# Altium footprint library My Footprint 3D.PCBLIB: 447 footprints (part 14 of 29)
Each footprint in its own frame and in the unit in brackets; x right, y up, seen from the top. Pads: shape width x height; smd on the part's side, far side on the other; paste and mask are expansions set on the pad; w line width, h text height; cw(c..) or ccw(c..) is an arc to the next point about the centre after c.
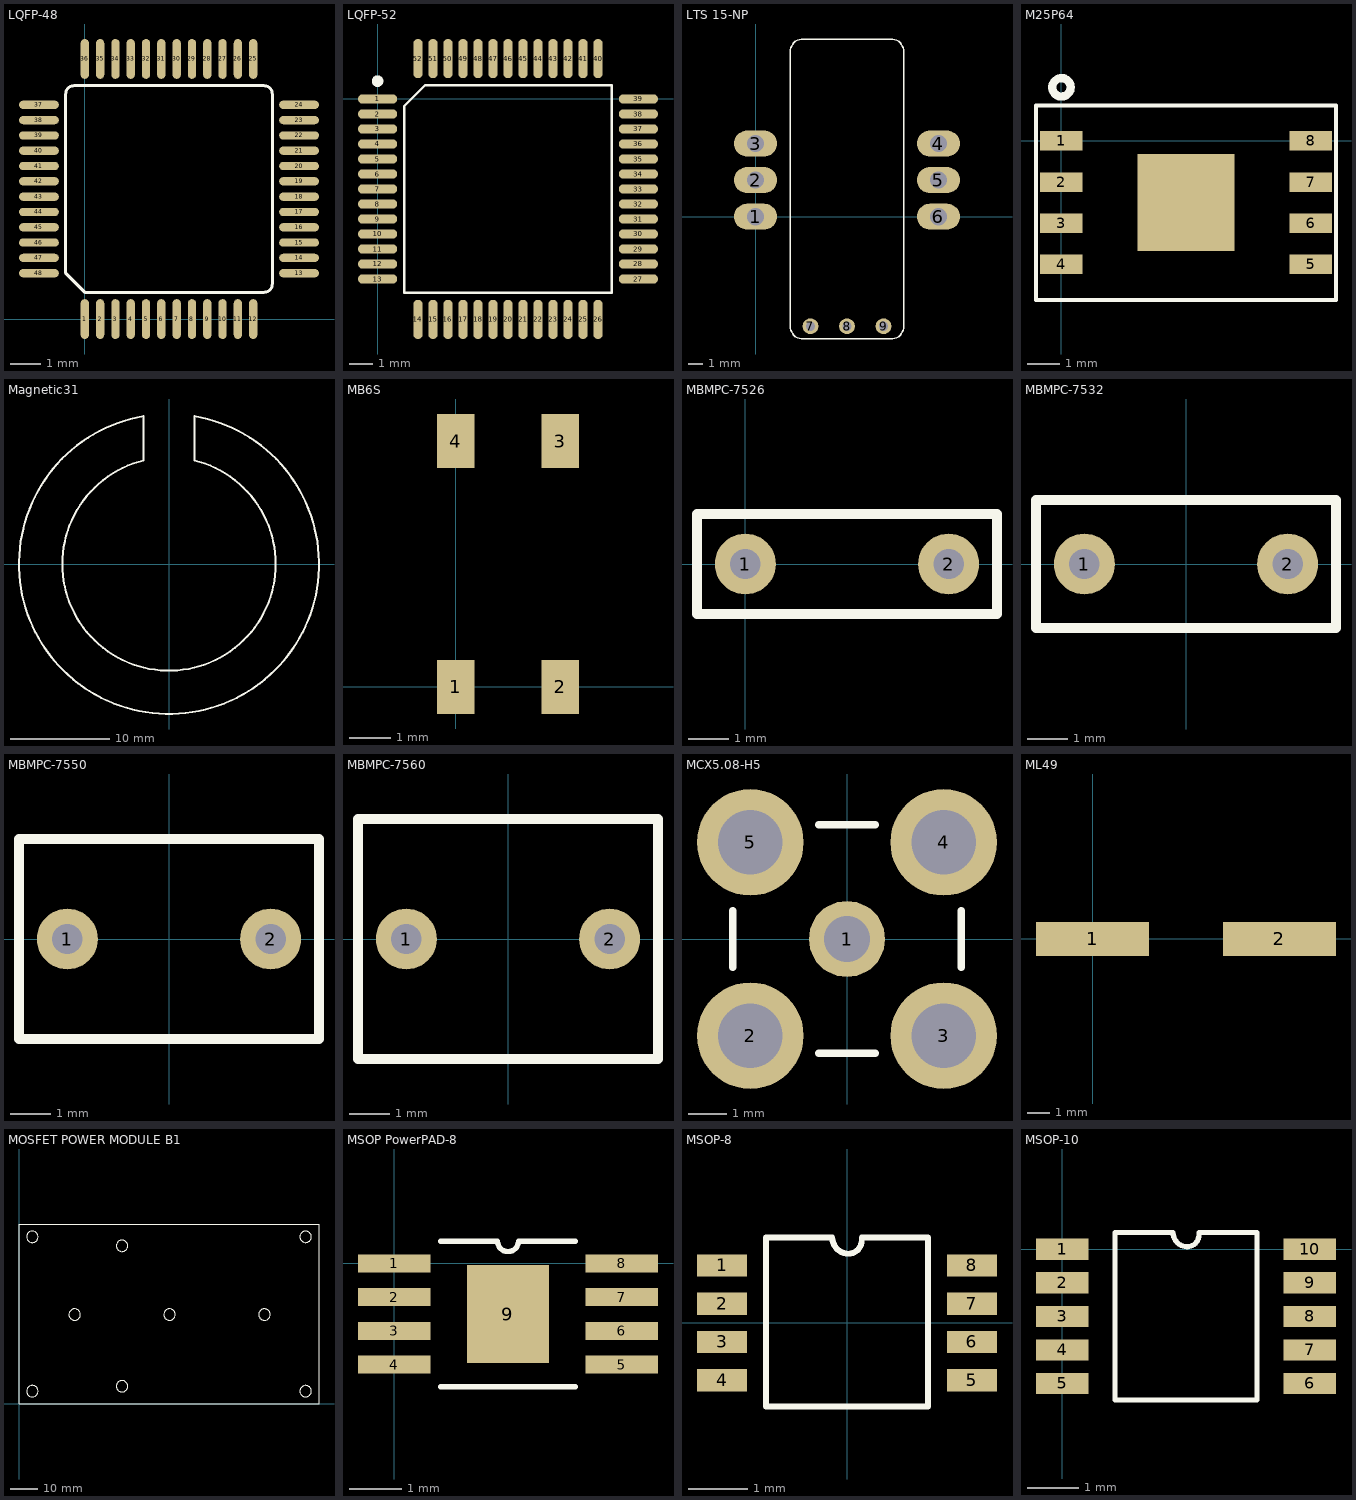
[diagram p13: the footprints below, top view; thin cyan lines are the x and y axes]

## LQFP-48 [mm] "distance 0.5mm"
pads (48):
  oval 0.27x1.3 smd: 1(0,0) 2(0.5,0) 3(1,0) 4(1.5,0) 5(2,0) 6(2.5,0) 7(3,0) 8(3.5,0) 9(4,0) 10(4.5,0) 11(5,0) 12(5.5,0) 25(5.5,8.5) 26(5,8.5) 27(4.5,8.5) 28(4,8.5) 29(3.5,8.5) 30(3,8.5) 31(2.5,8.5) 32(2,8.5) 33(1.5,8.5) 34(1,8.5) 35(0.5,8.5) 36(0,8.5)
  oval 1.3x0.27 smd: 13(7,1.5) 14(7,2) 15(7,2.5) 16(7,3) 17(7,3.5) 18(7,4) 19(7,4.5) 20(7,5) 21(7,5.5) 22(7,6) 23(7,6.5) 24(7,7) 37(-1.5,7) 38(-1.5,6.5) 39(-1.5,6) 40(-1.5,5.5) 41(-1.5,5) 42(-1.5,4.5) 43(-1.5,4) 44(-1.5,3.5) 45(-1.5,3) 46(-1.5,2.5) 47(-1.5,2) 48(-1.5,1.5)
Top Overlay:
  lines w0.1: -0.625,1.5 -0.625,7.35 cw(c-0.35,7.35) -0.35,7.625 5.85,7.625 cw(c5.85,7.35) 6.125,7.35 6.125,1.15 cw(c5.85,1.15) 5.85,0.875 0,0.875 -0.625,1.5
3D body: height 1, standoff 0.8, extent -0.127,0.406 0.127,0.66
3D body: height 1, standoff 0, extent -0.127,0.203 0.127,0.406
3D body: height 0.3, standoff 0, extent -0.127,-0.483 0.127,0.203
3D body: height 1.6, standoff 0.1, extent -0.857,0.643 6.382,7.857
3D body: height 1.61, standoff 1.6, extent -0.3,1.2 0.3,1.8
3D body: height 0.3, standoff 0, extent 0.373,-0.483 0.627,0.203
3D body: height 1, standoff 0, extent 0.373,0.203 0.627,0.406
3D body: height 1, standoff 0.8, extent 0.373,0.406 0.627,0.66
3D body: height 0.3, standoff 0, extent 0.873,-0.483 1.127,0.203
3D body: height 1, standoff 0, extent 0.873,0.203 1.127,0.406
3D body: height 1, standoff 0.8, extent 0.873,0.406 1.127,0.66
3D body: height 0.3, standoff 0, extent 1.373,-0.483 1.627,0.203
3D body: height 1, standoff 0, extent 1.373,0.203 1.627,0.406
3D body: height 1, standoff 0.8, extent 1.373,0.406 1.627,0.66
3D body: height 0.3, standoff 0, extent 1.873,-0.483 2.127,0.203
3D body: height 1, standoff 0, extent 1.873,0.203 2.127,0.406
3D body: height 1, standoff 0.8, extent 1.873,0.406 2.127,0.66
3D body: height 0.3, standoff 0, extent 2.373,-0.483 2.627,0.203
3D body: height 1, standoff 0, extent 2.373,0.203 2.627,0.406
3D body: height 1, standoff 0.8, extent 2.373,0.406 2.627,0.66
3D body: height 0.3, standoff 0, extent 2.873,-0.483 3.127,0.203
3D body: height 1, standoff 0, extent 2.873,0.203 3.127,0.406
3D body: height 1, standoff 0.8, extent 2.873,0.406 3.127,0.66
3D body: height 0.3, standoff 0, extent 3.373,-0.483 3.627,0.203
3D body: height 1, standoff 0, extent 3.373,0.203 3.627,0.406
3D body: height 1, standoff 0.8, extent 3.373,0.406 3.627,0.66
3D body: height 0.3, standoff 0, extent 3.873,-0.483 4.127,0.203
3D body: height 1, standoff 0, extent 3.873,0.203 4.127,0.406
3D body: height 1, standoff 0.8, extent 3.873,0.406 4.127,0.66
3D body: height 0.3, standoff 0, extent 4.373,-0.483 4.627,0.203
3D body: height 1, standoff 0, extent 4.373,0.203 4.627,0.406
3D body: height 1, standoff 0.8, extent 4.373,0.406 4.627,0.66
3D body: height 0.3, standoff 0, extent 4.873,-0.483 5.127,0.203
3D body: height 1, standoff 0, extent 4.873,0.203 5.127,0.406
3D body: height 1, standoff 0.8, extent 4.873,0.406 5.127,0.66
3D body: height 0.3, standoff 0, extent 5.373,-0.483 5.627,0.203
3D body: height 1, standoff 0, extent 5.373,0.203 5.627,0.406
3D body: height 1, standoff 0.8, extent 5.373,0.406 5.627,0.66
3D body: height 1, standoff 0.8, extent 6.34,6.873 6.594,7.127
3D body: height 1, standoff 0, extent 6.594,6.873 6.797,7.127
3D body: height 0.3, standoff 0, extent 6.797,6.873 7.483,7.127
3D body: height 1, standoff 0.8, extent 6.34,6.373 6.594,6.627
3D body: height 1, standoff 0, extent 6.594,6.373 6.797,6.627
3D body: height 0.3, standoff 0, extent 6.797,6.373 7.483,6.627
3D body: height 1, standoff 0.8, extent 6.34,5.873 6.594,6.127
3D body: height 1, standoff 0, extent 6.594,5.873 6.797,6.127
3D body: height 0.3, standoff 0, extent 6.797,5.873 7.483,6.127
3D body: height 1, standoff 0.8, extent 6.34,5.373 6.594,5.627
3D body: height 1, standoff 0, extent 6.594,5.373 6.797,5.627
3D body: height 0.3, standoff 0, extent 6.797,5.373 7.483,5.627
3D body: height 1, standoff 0.8, extent 6.34,4.873 6.594,5.127
3D body: height 1, standoff 0, extent 6.594,4.873 6.797,5.127
3D body: height 0.3, standoff 0, extent 6.797,4.873 7.483,5.127
3D body: height 1, standoff 0.8, extent 6.34,4.373 6.594,4.627
3D body: height 1, standoff 0, extent 6.594,4.373 6.797,4.627
3D body: height 0.3, standoff 0, extent 6.797,4.373 7.483,4.627
3D body: height 1, standoff 0.8, extent 6.34,3.873 6.594,4.127
3D body: height 1, standoff 0, extent 6.594,3.873 6.797,4.127
3D body: height 0.3, standoff 0, extent 6.797,3.873 7.483,4.127
3D body: height 1, standoff 0.8, extent 6.34,3.373 6.594,3.627
3D body: height 1, standoff 0, extent 6.594,3.373 6.797,3.627
3D body: height 0.3, standoff 0, extent 6.797,3.373 7.483,3.627
3D body: height 1, standoff 0.8, extent 6.34,2.873 6.594,3.127
3D body: height 1, standoff 0, extent 6.594,2.873 6.797,3.127
3D body: height 0.3, standoff 0, extent 6.797,2.873 7.483,3.127
3D body: height 1, standoff 0.8, extent 6.34,2.373 6.594,2.627
3D body: height 1, standoff 0, extent 6.594,2.373 6.797,2.627
3D body: height 0.3, standoff 0, extent 6.797,2.373 7.483,2.627
3D body: height 1, standoff 0.8, extent 6.34,1.873 6.594,2.127
3D body: height 1, standoff 0, extent 6.594,1.873 6.797,2.127
3D body: height 0.3, standoff 0, extent 6.797,1.873 7.483,2.127
3D body: height 0.3, standoff 0, extent 6.797,1.373 7.483,1.627
3D body: height 1, standoff 0, extent 6.594,1.373 6.797,1.627
3D body: height 1, standoff 0.8, extent 6.34,1.373 6.594,1.627
3D body: height 1, standoff 0.8, extent -0.127,7.84 0.127,8.094
3D body: height 1, standoff 0, extent -0.127,8.094 0.127,8.297
3D body: height 0.3, standoff 0, extent -0.127,8.297 0.127,8.983
3D body: height 1, standoff 0.8, extent 0.373,7.84 0.627,8.094
3D body: height 1, standoff 0, extent 0.373,8.094 0.627,8.297
3D body: height 0.3, standoff 0, extent 0.373,8.297 0.627,8.983
3D body: height 1, standoff 0.8, extent 0.873,7.84 1.127,8.094
3D body: height 1, standoff 0, extent 0.873,8.094 1.127,8.297
3D body: height 0.3, standoff 0, extent 0.873,8.297 1.127,8.983
3D body: height 1, standoff 0.8, extent 1.373,7.84 1.627,8.094
3D body: height 1, standoff 0, extent 1.373,8.094 1.627,8.297
3D body: height 0.3, standoff 0, extent 1.373,8.297 1.627,8.983
3D body: height 1, standoff 0.8, extent 1.873,7.84 2.127,8.094
3D body: height 1, standoff 0, extent 1.873,8.094 2.127,8.297
3D body: height 0.3, standoff 0, extent 1.873,8.297 2.127,8.983
3D body: height 1, standoff 0.8, extent 2.373,7.84 2.627,8.094
3D body: height 1, standoff 0, extent 2.373,8.094 2.627,8.297
3D body: height 0.3, standoff 0, extent 2.373,8.297 2.627,8.983
3D body: height 1, standoff 0.8, extent 2.873,7.84 3.127,8.094
3D body: height 1, standoff 0, extent 2.873,8.094 3.127,8.297
3D body: height 0.3, standoff 0, extent 2.873,8.297 3.127,8.983
3D body: height 1, standoff 0.8, extent 3.373,7.84 3.627,8.094
3D body: height 1, standoff 0, extent 3.373,8.094 3.627,8.297
3D body: height 0.3, standoff 0, extent 3.373,8.297 3.627,8.983
3D body: height 1, standoff 0.8, extent 3.873,7.84 4.127,8.094
3D body: height 1, standoff 0, extent 3.873,8.094 4.127,8.297
3D body: height 0.3, standoff 0, extent 3.873,8.297 4.127,8.983
3D body: height 1, standoff 0.8, extent 4.373,7.84 4.627,8.094
3D body: height 1, standoff 0, extent 4.373,8.094 4.627,8.297
3D body: height 0.3, standoff 0, extent 4.373,8.297 4.627,8.983
3D body: height 1, standoff 0.8, extent 4.873,7.84 5.127,8.094
3D body: height 1, standoff 0, extent 4.873,8.094 5.127,8.297
3D body: height 0.3, standoff 0, extent 4.873,8.297 5.127,8.983
3D body: height 0.3, standoff 0, extent 5.373,8.297 5.627,8.983
3D body: height 1, standoff 0, extent 5.373,8.094 5.627,8.297
3D body: height 1, standoff 0.8, extent 5.373,7.84 5.627,8.094
3D body: height 1, standoff 0.8, extent -1.094,1.373 -0.84,1.627
3D body: height 1, standoff 0, extent -1.297,1.373 -1.094,1.627
3D body: height 0.3, standoff 0, extent -1.983,1.373 -1.297,1.627
3D body: height 1, standoff 0.8, extent -1.094,1.873 -0.84,2.127
3D body: height 1, standoff 0, extent -1.297,1.873 -1.094,2.127
3D body: height 0.3, standoff 0, extent -1.983,1.873 -1.297,2.127
3D body: height 1, standoff 0.8, extent -1.094,2.373 -0.84,2.627
3D body: height 1, standoff 0, extent -1.297,2.373 -1.094,2.627
3D body: height 0.3, standoff 0, extent -1.983,2.373 -1.297,2.627
3D body: height 1, standoff 0.8, extent -1.094,2.873 -0.84,3.127
3D body: height 1, standoff 0, extent -1.297,2.873 -1.094,3.127
3D body: height 0.3, standoff 0, extent -1.983,2.873 -1.297,3.127
3D body: height 1, standoff 0.8, extent -1.094,3.373 -0.84,3.627
3D body: height 1, standoff 0, extent -1.297,3.373 -1.094,3.627
3D body: height 0.3, standoff 0, extent -1.983,3.373 -1.297,3.627
3D body: height 1, standoff 0.8, extent -1.094,3.873 -0.84,4.127
3D body: height 1, standoff 0, extent -1.297,3.873 -1.094,4.127
3D body: height 0.3, standoff 0, extent -1.983,3.873 -1.297,4.127
3D body: height 1, standoff 0.8, extent -1.094,4.373 -0.84,4.627
3D body: height 1, standoff 0, extent -1.297,4.373 -1.094,4.627
3D body: height 0.3, standoff 0, extent -1.983,4.373 -1.297,4.627
3D body: height 1, standoff 0.8, extent -1.094,4.873 -0.84,5.127
3D body: height 1, standoff 0, extent -1.297,4.873 -1.094,5.127
3D body: height 0.3, standoff 0, extent -1.983,4.873 -1.297,5.127
3D body: height 1, standoff 0.8, extent -1.094,5.373 -0.84,5.627
3D body: height 1, standoff 0, extent -1.297,5.373 -1.094,5.627
3D body: height 0.3, standoff 0, extent -1.983,5.373 -1.297,5.627
3D body: height 1, standoff 0.8, extent -1.094,5.873 -0.84,6.127
3D body: height 1, standoff 0, extent -1.297,5.873 -1.094,6.127
3D body: height 0.3, standoff 0, extent -1.983,5.873 -1.297,6.127
3D body: height 1, standoff 0.8, extent -1.094,6.373 -0.84,6.627
3D body: height 1, standoff 0, extent -1.297,6.373 -1.094,6.627
3D body: height 0.3, standoff 0, extent -1.983,6.373 -1.297,6.627
3D body: height 0.3, standoff 0, extent -1.983,6.873 -1.297,7.127
3D body: height 1, standoff 0, extent -1.297,6.873 -1.094,7.127
3D body: height 1, standoff 0.8, extent -1.094,6.873 -0.84,7.127

## LQFP-52 [mm]
pads (52):
  oval 1.7x0.4 smd: 1(0,0) 2(0,-0.65) 3(0,-1.3) 4(0,-1.95) 5(0,-2.6) 6(0,-3.25) 7(0,-3.9) 8(0,-4.55) 9(0,-5.2) 10(0,-5.85) 11(0,-6.5) 12(0,-7.15) 13(0,-7.8) 27(11.3,-7.8) 28(11.3,-7.15) 29(11.3,-6.5) 30(11.3,-5.85) 31(11.3,-5.2) 32(11.3,-4.55) 33(11.3,-3.9) 34(11.3,-3.25) 35(11.3,-2.6) 36(11.3,-1.95) 37(11.3,-1.3) 38(11.3,-0.65) 39(11.3,0)
  oval 0.4x1.7 smd: 14(1.75,-9.55) 15(2.4,-9.55) 16(3.05,-9.55) 17(3.7,-9.55) 18(4.35,-9.55) 19(5,-9.55) 20(5.65,-9.55) 21(6.3,-9.55) 22(6.95,-9.55) 23(7.6,-9.55) 24(8.25,-9.55) 25(8.9,-9.55) 26(9.55,-9.55) 40(9.55,1.75) 41(8.9,1.75) 42(8.25,1.75) 43(7.6,1.75) 44(6.95,1.75) 45(6.3,1.75) 46(5.65,1.75) 47(5,1.75) 48(4.35,1.75) 49(3.7,1.75) 50(3.05,1.75) 51(2.4,1.75) 52(1.75,1.75)
Top Overlay:
  circle w0.25: c0,0.775 r0.125
  lines w0.1: 1.15,-8.4 1.15,-0.4 1.15,-0.3 2.05,0.6 10.15,0.6 10.15,-8.4 1.15,-8.4
3D body: height 0.2, standoff 0, extent -0.494,-1.488 0.192,-1.11
3D body: height 0.7, standoff 0, extent 0.192,-1.488 0.395,-1.11
3D body: height 0.7, standoff 0.5, extent 0.395,-1.488 0.649,-1.11
3D body: height 0.2, standoff 0, extent -0.494,-0.838 0.192,-0.46
3D body: height 0.7, standoff 0, extent 0.192,-0.838 0.395,-0.46
3D body: height 0.7, standoff 0.5, extent 0.395,-0.838 0.649,-0.46
3D body: height 1.31, standoff 0.1, extent 1.5,-0.9 2.695,0.298
3D body: height 0.7, standoff 0.5, extent 0.395,-0.188 0.649,0.19
3D body: height 0.7, standoff 0, extent 0.192,-0.188 0.395,0.19
3D body: height 0.2, standoff 0, extent -0.494,-0.188 0.192,0.19
3D body: height 0.7, standoff 0.5, extent 0.395,-2.138 0.649,-1.76
3D body: height 0.7, standoff 0, extent 0.192,-2.138 0.395,-1.76
3D body: height 0.2, standoff 0, extent -0.494,-2.138 0.192,-1.76
3D body: height 0.7, standoff 0.5, extent 0.395,-2.788 0.649,-2.41
3D body: height 0.7, standoff 0, extent 0.192,-2.788 0.395,-2.41
3D body: height 0.2, standoff 0, extent -0.494,-2.788 0.192,-2.41
3D body: height 0.7, standoff 0.5, extent 0.395,-3.438 0.649,-3.06
3D body: height 0.7, standoff 0, extent 0.192,-3.438 0.395,-3.06
3D body: height 0.2, standoff 0, extent -0.494,-3.438 0.192,-3.06
3D body: height 0.7, standoff 0.5, extent 0.395,-4.088 0.649,-3.71
3D body: height 0.7, standoff 0, extent 0.192,-4.088 0.395,-3.71
3D body: height 0.2, standoff 0, extent -0.494,-4.088 0.192,-3.71
3D body: height 0.7, standoff 0.5, extent 0.395,-4.738 0.649,-4.36
3D body: height 0.7, standoff 0, extent 0.192,-4.738 0.395,-4.36
3D body: height 0.2, standoff 0, extent -0.494,-4.738 0.192,-4.36
3D body: height 0.7, standoff 0.5, extent 0.395,-5.388 0.649,-5.01
3D body: height 0.7, standoff 0, extent 0.192,-5.388 0.395,-5.01
3D body: height 0.2, standoff 0, extent -0.494,-5.388 0.192,-5.01
3D body: height 0.7, standoff 0.5, extent 0.395,-6.038 0.649,-5.66
3D body: height 0.7, standoff 0, extent 0.192,-6.038 0.395,-5.66
3D body: height 0.2, standoff 0, extent -0.494,-6.038 0.192,-5.66
3D body: height 0.7, standoff 0.5, extent 0.395,-6.688 0.649,-6.31
3D body: height 0.7, standoff 0, extent 0.192,-6.688 0.395,-6.31
3D body: height 0.2, standoff 0, extent -0.494,-6.688 0.192,-6.31
3D body: height 0.7, standoff 0.5, extent 0.395,-7.338 0.649,-6.96
3D body: height 0.7, standoff 0, extent 0.192,-7.338 0.395,-6.96
3D body: height 0.2, standoff 0, extent -0.494,-7.338 0.192,-6.96
3D body: height 0.7, standoff 0.5, extent 0.395,-7.988 0.649,-7.61
3D body: height 0.7, standoff 0, extent 0.192,-7.988 0.395,-7.61
3D body: height 0.2, standoff 0, extent -0.494,-7.988 0.192,-7.61
3D body: height 0.7, standoff 0.5, extent 1.56,-9.155 1.938,-8.901
3D body: height 0.7, standoff 0, extent 1.56,-9.358 1.938,-9.155
3D body: height 0.2, standoff 0, extent 1.56,-10.044 1.938,-9.358
3D body: height 0.7, standoff 0.5, extent 2.21,-9.155 2.588,-8.901
3D body: height 0.7, standoff 0, extent 2.21,-9.358 2.588,-9.155
3D body: height 0.2, standoff 0, extent 2.21,-10.044 2.588,-9.358
3D body: height 0.7, standoff 0.5, extent 2.86,-9.155 3.238,-8.901
3D body: height 0.7, standoff 0, extent 2.86,-9.358 3.238,-9.155
3D body: height 0.2, standoff 0, extent 2.86,-10.044 3.238,-9.358
3D body: height 0.7, standoff 0.5, extent 3.51,-9.155 3.888,-8.901
3D body: height 0.7, standoff 0, extent 3.51,-9.358 3.888,-9.155
3D body: height 0.2, standoff 0, extent 3.51,-10.044 3.888,-9.358
3D body: height 0.7, standoff 0.5, extent 4.16,-9.155 4.538,-8.901
3D body: height 0.7, standoff 0, extent 4.16,-9.358 4.538,-9.155
3D body: height 0.2, standoff 0, extent 4.16,-10.044 4.538,-9.358
3D body: height 0.7, standoff 0.5, extent 4.81,-9.155 5.188,-8.901
3D body: height 0.7, standoff 0, extent 4.81,-9.358 5.188,-9.155
3D body: height 0.2, standoff 0, extent 4.81,-10.044 5.188,-9.358
3D body: height 0.7, standoff 0.5, extent 5.46,-9.155 5.838,-8.901
3D body: height 0.7, standoff 0, extent 5.46,-9.358 5.838,-9.155
3D body: height 0.2, standoff 0, extent 5.46,-10.044 5.838,-9.358
3D body: height 0.7, standoff 0.5, extent 6.11,-9.155 6.488,-8.901
3D body: height 0.7, standoff 0, extent 6.11,-9.358 6.488,-9.155
3D body: height 0.2, standoff 0, extent 6.11,-10.044 6.488,-9.358
3D body: height 0.7, standoff 0.5, extent 6.76,-9.155 7.138,-8.901
3D body: height 0.7, standoff 0, extent 6.76,-9.358 7.138,-9.155
3D body: height 0.2, standoff 0, extent 6.76,-10.044 7.138,-9.358
3D body: height 0.7, standoff 0.5, extent 7.41,-9.155 7.788,-8.901
3D body: height 0.7, standoff 0, extent 7.41,-9.358 7.788,-9.155
3D body: height 0.2, standoff 0, extent 7.41,-10.044 7.788,-9.358
3D body: height 0.7, standoff 0.5, extent 8.06,-9.155 8.438,-8.901
3D body: height 0.7, standoff 0, extent 8.06,-9.358 8.438,-9.155
3D body: height 0.2, standoff 0, extent 8.06,-10.044 8.438,-9.358
3D body: height 0.7, standoff 0.5, extent 8.71,-9.155 9.088,-8.901
3D body: height 0.7, standoff 0, extent 8.71,-9.358 9.088,-9.155
3D body: height 0.2, standoff 0, extent 8.71,-10.044 9.088,-9.358
3D body: height 0.7, standoff 0.5, extent 9.36,-9.155 9.738,-8.901
3D body: height 0.7, standoff 0, extent 9.36,-9.358 9.738,-9.155
3D body: height 0.2, standoff 0, extent 9.36,-10.044 9.738,-9.358
3D body: height 0.7, standoff 0.5, extent 10.651,-7.99 10.905,-7.612
3D body: height 0.7, standoff 0, extent 10.905,-7.99 11.108,-7.612
3D body: height 0.2, standoff 0, extent 11.108,-7.99 11.794,-7.612
3D body: height 0.7, standoff 0.5, extent 10.651,-7.34 10.905,-6.962
3D body: height 0.7, standoff 0, extent 10.905,-7.34 11.108,-6.962
3D body: height 0.2, standoff 0, extent 11.108,-7.34 11.794,-6.962
3D body: height 0.7, standoff 0.5, extent 10.651,-6.69 10.905,-6.312
3D body: height 0.7, standoff 0, extent 10.905,-6.69 11.108,-6.312
3D body: height 0.2, standoff 0, extent 11.108,-6.69 11.794,-6.312
3D body: height 0.7, standoff 0.5, extent 10.651,-6.04 10.905,-5.662
3D body: height 0.7, standoff 0, extent 10.905,-6.04 11.108,-5.662
3D body: height 0.2, standoff 0, extent 11.108,-6.04 11.794,-5.662
3D body: height 0.7, standoff 0.5, extent 10.651,-5.39 10.905,-5.012
3D body: height 0.7, standoff 0, extent 10.905,-5.39 11.108,-5.012
3D body: height 0.2, standoff 0, extent 11.108,-5.39 11.794,-5.012
3D body: height 0.7, standoff 0.5, extent 10.651,-4.74 10.905,-4.362
3D body: height 0.7, standoff 0, extent 10.905,-4.74 11.108,-4.362
3D body: height 0.2, standoff 0, extent 11.108,-4.74 11.794,-4.362
3D body: height 0.7, standoff 0.5, extent 10.651,-4.09 10.905,-3.712
3D body: height 0.7, standoff 0, extent 10.905,-4.09 11.108,-3.712
3D body: height 0.2, standoff 0, extent 11.108,-4.09 11.794,-3.712
3D body: height 0.7, standoff 0.5, extent 10.651,-3.44 10.905,-3.062
3D body: height 0.7, standoff 0, extent 10.905,-3.44 11.108,-3.062
3D body: height 0.2, standoff 0, extent 11.108,-3.44 11.794,-3.062
3D body: height 0.7, standoff 0.5, extent 10.651,-2.79 10.905,-2.412
3D body: height 0.7, standoff 0, extent 10.905,-2.79 11.108,-2.412
3D body: height 0.2, standoff 0, extent 11.108,-2.79 11.794,-2.412
3D body: height 0.7, standoff 0.5, extent 10.651,-2.14 10.905,-1.762
3D body: height 0.7, standoff 0, extent 10.905,-2.14 11.108,-1.762
3D body: height 0.2, standoff 0, extent 11.108,-2.14 11.794,-1.762
3D body: height 0.7, standoff 0.5, extent 10.651,-1.49 10.905,-1.112
3D body: height 0.7, standoff 0, extent 10.905,-1.49 11.108,-1.112
3D body: height 0.2, standoff 0, extent 11.108,-1.49 11.794,-1.112
3D body: height 0.7, standoff 0.5, extent 10.651,-0.84 10.905,-0.462
3D body: height 0.7, standoff 0, extent 10.905,-0.84 11.108,-0.462
3D body: height 0.2, standoff 0, extent 11.108,-0.84 11.794,-0.462
3D body: height 0.7, standoff 0.5, extent 10.651,-0.19 10.905,0.188
3D body: height 0.7, standoff 0, extent 10.905,-0.19 11.108,0.188
3D body: height 0.2, standoff 0, extent 11.108,-0.19 11.794,0.188
3D body: height 0.7, standoff 0.5, extent 9.362,1.101 9.74,1.355
3D body: height 0.7, standoff 0, extent 9.362,1.355 9.74,1.558
3D body: height 0.2, standoff 0, extent 9.362,1.558 9.74,2.244
3D body: height 0.7, standoff 0.5, extent 8.712,1.101 9.09,1.355
3D body: height 0.7, standoff 0, extent 8.712,1.355 9.09,1.558
3D body: height 0.2, standoff 0, extent 8.712,1.558 9.09,2.244
3D body: height 0.7, standoff 0.5, extent 8.062,1.101 8.44,1.355
3D body: height 0.7, standoff 0, extent 8.062,1.355 8.44,1.558
3D body: height 0.2, standoff 0, extent 8.062,1.558 8.44,2.244
3D body: height 0.7, standoff 0.5, extent 7.412,1.101 7.79,1.355
3D body: height 0.7, standoff 0, extent 7.412,1.355 7.79,1.558
3D body: height 0.2, standoff 0, extent 7.412,1.558 7.79,2.244
3D body: height 0.7, standoff 0.5, extent 6.762,1.101 7.14,1.355
3D body: height 0.7, standoff 0, extent 6.762,1.355 7.14,1.558
3D body: height 0.2, standoff 0, extent 6.762,1.558 7.14,2.244
3D body: height 0.7, standoff 0.5, extent 6.112,1.101 6.49,1.355
3D body: height 0.7, standoff 0, extent 6.112,1.355 6.49,1.558
3D body: height 0.2, standoff 0, extent 6.112,1.558 6.49,2.244
3D body: height 0.7, standoff 0.5, extent 5.462,1.101 5.84,1.355
3D body: height 0.7, standoff 0, extent 5.462,1.355 5.84,1.558
3D body: height 0.2, standoff 0, extent 5.462,1.558 5.84,2.244
3D body: height 0.7, standoff 0.5, extent 4.812,1.101 5.19,1.355
3D body: height 0.7, standoff 0, extent 4.812,1.355 5.19,1.558
3D body: height 0.2, standoff 0, extent 4.812,1.558 5.19,2.244
3D body: height 0.7, standoff 0.5, extent 4.162,1.101 4.54,1.355
3D body: height 0.7, standoff 0, extent 4.162,1.355 4.54,1.558
3D body: height 0.2, standoff 0, extent 4.162,1.558 4.54,2.244
3D body: height 0.7, standoff 0.5, extent 3.512,1.101 3.89,1.355
3D body: height 0.7, standoff 0, extent 3.512,1.355 3.89,1.558
3D body: height 0.2, standoff 0, extent 3.512,1.558 3.89,2.244
3D body: height 0.7, standoff 0.5, extent 2.862,1.101 3.24,1.355
3D body: height 0.7, standoff 0, extent 2.862,1.355 3.24,1.558
3D body: height 0.2, standoff 0, extent 2.862,1.558 3.24,2.244
3D body: height 0.7, standoff 0.5, extent 2.212,1.101 2.59,1.355
3D body: height 0.7, standoff 0, extent 2.212,1.355 2.59,1.558
3D body: height 0.2, standoff 0, extent 2.212,1.558 2.59,2.244
3D body: height 0.7, standoff 0.5, extent 1.562,1.101 1.94,1.355
3D body: height 0.7, standoff 0, extent 1.562,1.355 1.94,1.558
3D body: height 0.2, standoff 0, extent 1.562,1.558 1.94,2.244
3D body: height 1.2, standoff 0.1, extent 0.65,-8.9 10.65,1.1

## LTS 15-NP [mm]
pads (9):
  oval 3x1.8 hole 1.2: 1(0,0) 2(0,2.54) 3(0,5.08) 4(12.7,5.08) 5(12.7,2.54) 6(12.7,0)
  round 1.1 hole 0.65: 7(3.81,-7.62) 8(6.35,-7.62) 9(8.89,-7.62)
Top Overlay:
  lines w0.1: 2.4,-7.6 ccw(c3.3,-7.6) 3.3,-8.5 9.4,-8.5 ccw(c9.4,-7.6) 10.3,-7.6 10.3,11.44 ccw(c9.4,11.44) 9.4,12.34 3.3,12.34 ccw(c3.3,11.44) 2.4,11.44 2.4,-7.6
3D body: height 2, standoff -1.5, extent 12.3,4.58 13.1,5.58
3D body: height 9.3, standoff 8.5, extent 11.1,4.08 13.1,6.08
3D body: height 9.3, standoff 0.5, extent 12.3,4.08 13.1,6.08
3D body: height 2, standoff -1.5, extent 12.3,2.04 13.1,3.04
3D body: height 9.3, standoff 8.5, extent 11.1,1.54 13.1,3.54
3D body: height 9.3, standoff 0.5, extent 12.3,1.54 13.1,3.54
3D body: height 2, standoff -1.5, extent 12.3,-0.5 13.1,0.5
3D body: height 9.3, standoff 8.5, extent 11.1,-1 13.1,1
3D body: height 9.3, standoff 0.5, extent 12.3,-1 13.1,1
3D body: height 2, standoff -1.5, extent -0.4,4.58 0.4,5.58
3D body: height 9.3, standoff 8.5, extent -0.4,4.08 1.6,6.08
3D body: height 9.3, standoff 0.5, extent -0.4,4.08 0.4,6.08
3D body: height 2, standoff -1.5, extent -0.4,2.04 0.4,3.04
3D body: height 9.3, standoff 8.5, extent -0.4,1.54 1.6,3.54
3D body: height 9.3, standoff 0.5, extent -0.4,1.54 0.4,3.54
3D body: height 24, standoff 21, extent 1.6,-9.07 11.1,-6.082
3D body: height 12.5, standoff 0, extent 1.6,4.967 11.1,12.967
3D body: height 20.5, standoff 0, extent 1.6,-9.07 11.1,4.998
3D body: height 20.48, standoff 4.52, extent 1.6,-2.97 11.1,12.967
3D body: height 24, standoff 21, extent 1.6,-2.064 11.1,0.924
3D body: height 22.5, standoff 20.5, extent 1.6,-9.07 11.1,0.924
3D body: height 24, standoff 20.5, extent 1.6,-7.576 11.1,-0.57
3D body: height 14, standoff 11, extent 1.55,1.536 11.15,4.524
3D body: height 9.3, standoff 0.5, extent -0.4,-1 0.4,1
3D body: height 9.3, standoff 8.5, extent -0.4,-1 1.6,1
3D body: height 2, standoff -1.5, extent -0.4,-0.5 0.4,0.5

## M25P64 [mm] "Body 6mmX8mm"
height 1
pads (9):
  rect 1.3x0.6 smd: 1(0,0) 2(0,-1.27) 3(0,-2.54) 4(0,-3.81) 5(7.7,-3.81) 6(7.7,-2.54) 7(7.7,-1.27) 8(7.7,0)
  rect 3x3 smd: ""(3.85,-1.905)
Top Overlay:
  circle w0.254: c0.01,1.651 r0.284
  lines w0.127: -0.777,-4.905 8.477,-4.905 8.477,1.095 -0.777,1.095 -0.777,-4.905

## Magnetic31 [mm]
height 9
Top Overlay:
  lines w0.2: 2.535,10.395 cw(c0,0) -2.535,10.395 -2.536,14.835 ccw(c0,0) 2.536,14.835 2.54,10.414

## MB6S [mm]
pads (4):
  rect 0.9x1.3 smd: 1(0,0) 2(2.5,0) 3(2.5,5.9) 4(0,5.9)
3D body: height 3.01, standoff 3, extent -0.594,1.402 0.004,2.001
3D body: height 0.2, standoff 0, extent -0.3,5.75 0.3,6.25
3D body: height 1.6, standoff 0, extent -0.3,5.55 0.3,5.75
3D body: height 1.6, standoff 1.4, extent -0.3,4.95 0.3,5.55
3D body: height 0.2, standoff 0, extent 2.2,5.75 2.8,6.25
3D body: height 1.6, standoff 0, extent 2.2,5.55 2.8,5.75
3D body: height 1.6, standoff 1.4, extent 2.2,4.95 2.8,5.55
3D body: height 0.2, standoff 0, extent 2.2,-0.35 2.8,0.15
3D body: height 1.6, standoff 0, extent 2.2,0.15 2.8,0.35
3D body: height 1.6, standoff 1.4, extent 2.2,0.35 2.8,0.95
3D body: height 3, standoff 0, extent -1.1,0.95 3.6,4.95
3D body: height 1.6, standoff 1.4, extent -0.3,0.35 0.3,0.95
3D body: height 1.6, standoff 0, extent -0.3,0.15 0.3,0.35
3D body: height 0.2, standoff 0, extent -0.3,-0.35 0.3,0.15

## MBMPC-7526 [mil]
pads (2):
  round 60 hole 30: 1(0,0) 2(200,0)
Top Overlay:
  lines w10: -47.64,-49.21 247.64,-49.21 247.64,49.21 -47.64,49.21 -47.64,-49.21

## MBMPC-7532 [mil]
pads (2):
  round 60 hole 30: 1(-100,0) 2(100,0)
Top Overlay:
  lines w10: -147.64,-62.99 147.64,-62.99 147.64,62.99 -147.64,62.99 -147.64,-62.99

## MBMPC-7550 [mil]
pads (2):
  round 60 hole 30: 1(-100,0) 2(100,0)
Top Overlay:
  lines w10: -147.64,-98.43 147.64,-98.43 147.64,98.43 -147.64,98.43 -147.64,-98.43

## MBMPC-7560 [mil]
pads (2):
  round 60 hole 30: 1(-100,0) 2(100,0)
Top Overlay:
  lines w10: -147.64,-118.11 -147.64,118.11 147.64,118.11 147.64,-118.11 -147.64,-118.11

## MCX5.08-H5 [mm]
pads (5):
  round 2 hole 1.2: 1(0,0)
  round 2.8 hole 1.7: 2(-2.54,-2.54) 3(2.54,-2.54) 4(2.54,2.54) 5(-2.54,2.54)
Top Overlay:
  lines w0.2: -3,-0.74 -3,0.74 ; -0.74,-3 0.74,-3 ; -0.74,3 0.74,3 ; 3,-0.74 3,0.74

## ML49 [mm]
height 7
pads (2):
  rect 5x1.5 smd: 1(0,0) 2(8.255,0)
3D body: height 1, standoff 0.2, extent -1.623,1.1 -0.423,2.3
3D body: height 1, standoff 0.2, extent 8.677,1.1 9.877,2.3
3D body: height 1, standoff 0.2, extent 8.677,-2.3 9.877,-1.1
3D body: height 1, standoff 0.2, extent -1.623,-2.3 -0.423,-1.1
3D body: height 0.3, standoff 0, extent 5.9,-0.3 10.4,0.5
3D body: height 0.3, standoff 0, extent -2.073,-0.4 2.427,0.4
3D body: height 4, standoff 0.2, extent -1.272,-2.1 9.527,2.1
3D body: height 1.2, standoff 0.6, extent -1.623,-2.3 9.877,2.3
3D body: height 0.6, standoff 0, extent -1.623,-2.3 9.877,2.3

## MOSFET POWER MODULE B1 [mm]
Top Overlay:
  circle w0.254: c4.9,4.7 r2.1
  circle w0.254: c4.9,61.3 r2.1
  circle w0.254: c37.8,6.5 r2.1
  circle w0.254: c37.8,58 r2.1
  circle w0.254: c20.4,32.8 r2.1
  circle w0.254: c55.2,32.8 r2.1
  circle w0.254: c90,32.8 r2.1
  circle w0.254: c105.1,4.7 r2.1
  circle w0.254: c105.1,61.3 r2.1
  lines w0.2: 0,0 110,0 110,66 0,66 0,0

## MSOP PowerPAD-8 [mm]
pads (9):
  rect 1.4x0.35 smd: 1(0,0) 2(0,-0.65) 3(0,-1.3) 4(0,-1.95) 5(4.375,-1.95) 6(4.375,-1.3) 7(4.375,-0.65) 8(4.375,0)
  rect 1.57x1.89 smd: 9(2.187,-0.975)
Top Overlay:
  lines w0.1: 0.887,-2.375 3.487,-2.375 ; 0.887,0.425 1.987,0.425 ccw(c2.187,0.425) 2.387,0.425 3.487,0.425
3D body: height 1.01, standoff 0, extent 1.115,-0.199 1.713,0.399
3D body: height 0.2, standoff 0, extent -0.363,-0.2 0.237,0.2
3D body: height 0.6, standoff 0, extent 0.237,-0.2 0.437,0.2
3D body: height 0.6, standoff 0.4, extent 0.437,-0.2 0.687,0.2
3D body: height 1, standoff 0, extent 0.688,-2.575 3.688,0.625
3D body: height 0.6, standoff 0.4, extent 0.437,-0.85 0.687,-0.45
3D body: height 0.6, standoff 0, extent 0.237,-0.85 0.437,-0.45
3D body: height 0.2, standoff 0, extent -0.363,-0.85 0.237,-0.45
3D body: height 0.6, standoff 0.4, extent 0.437,-1.5 0.687,-1.1
3D body: height 0.6, standoff 0, extent 0.237,-1.5 0.437,-1.1
3D body: height 0.2, standoff 0, extent -0.363,-1.5 0.237,-1.1
3D body: height 0.6, standoff 0.4, extent 0.437,-2.15 0.687,-1.75
3D body: height 0.6, standoff 0, extent 0.237,-2.15 0.437,-1.75
3D body: height 0.2, standoff 0, extent -0.363,-2.15 0.237,-1.75
3D body: height 0.6, standoff 0.4, extent 3.688,-2.15 3.938,-1.75
3D body: height 0.6, standoff 0, extent 3.938,-2.15 4.138,-1.75
3D body: height 0.2, standoff 0, extent 4.138,-2.15 4.738,-1.75
3D body: height 0.6, standoff 0.4, extent 3.688,-1.5 3.938,-1.1
3D body: height 0.6, standoff 0, extent 3.938,-1.5 4.138,-1.1
3D body: height 0.2, standoff 0, extent 4.138,-1.5 4.738,-1.1
3D body: height 0.6, standoff 0.4, extent 3.688,-0.85 3.938,-0.45
3D body: height 0.6, standoff 0, extent 3.938,-0.85 4.138,-0.45
3D body: height 0.2, standoff 0, extent 4.138,-0.85 4.738,-0.45
3D body: height 0.6, standoff 0.4, extent 3.688,-0.2 3.938,0.2
3D body: height 0.6, standoff 0, extent 3.938,-0.2 4.138,0.2
3D body: height 0.2, standoff 0, extent 4.138,-0.2 4.738,0.2

## MSOP-8 [mm]
height 0.86
pads (8):
  rect 0.85x0.38 smd: 1(-2.125,0.975) 2(-2.125,0.325) 3(-2.125,-0.325) 4(-2.125,-0.975) 5(2.125,-0.975) 6(2.125,-0.325) 7(2.125,0.325) 8(2.125,0.975)
Top Overlay:
  lines w0.1: -1.375,-1.425 1.375,-1.425 1.375,1.45 0.25,1.45 0.25,1.4 cw(c0.025,1.4) 0.025,1.175 cw(c0.025,1.45) -0.25,1.45 -1.375,1.45 -1.375,-1.425
3D body: height 1, standoff 0, extent -1.5,-1.55 1.5,1.55
3D body: height 0.6, standoff 0.4, extent -1.75,0.775 -1.5,1.175
3D body: height 0.6, standoff 0, extent -1.95,0.775 -1.75,1.175
3D body: height 0.2, standoff 0, extent -2.5,0.775 -1.95,1.175
3D body: height 1.01, standoff 0, extent -1.173,0.701 -0.575,1.299
3D body: height 0.2, standoff 0, extent -2.5,0.125 -1.95,0.525
3D body: height 0.6, standoff 0, extent -1.95,0.125 -1.75,0.525
3D body: height 0.6, standoff 0.4, extent -1.75,0.125 -1.5,0.525
3D body: height 0.2, standoff 0, extent -2.5,-0.525 -1.95,-0.125
3D body: height 0.6, standoff 0, extent -1.95,-0.525 -1.75,-0.125
3D body: height 0.6, standoff 0.4, extent -1.75,-0.525 -1.5,-0.125
3D body: height 0.2, standoff 0, extent -2.5,-1.175 -1.95,-0.775
3D body: height 0.6, standoff 0, extent -1.95,-1.175 -1.75,-0.775
3D body: height 0.6, standoff 0.4, extent -1.75,-1.175 -1.5,-0.775
3D body: height 0.2, standoff 0, extent 1.95,-1.175 2.5,-0.775
3D body: height 0.6, standoff 0, extent 1.75,-1.175 1.95,-0.775
3D body: height 0.6, standoff 0.4, extent 1.5,-1.175 1.75,-0.775
3D body: height 0.2, standoff 0, extent 1.95,-0.525 2.5,-0.125
3D body: height 0.6, standoff 0, extent 1.75,-0.525 1.95,-0.125
3D body: height 0.6, standoff 0.4, extent 1.5,-0.525 1.75,-0.125
3D body: height 0.2, standoff 0, extent 1.95,0.125 2.5,0.525
3D body: height 0.6, standoff 0, extent 1.75,0.125 1.95,0.525
3D body: height 0.6, standoff 0.4, extent 1.5,0.125 1.75,0.525
3D body: height 0.2, standoff 0, extent 1.95,0.775 2.5,1.175
3D body: height 0.6, standoff 0, extent 1.75,0.775 1.95,1.175
3D body: height 0.6, standoff 0.4, extent 1.5,0.775 1.75,1.175

## MSOP-10 [mm]
pads (10):
  rect 1.02x0.41 smd: 1(0,0) 2(0,-0.65) 3(0,-1.3) 4(0,-1.95) 5(0,-2.6) 6(4.8,-2.6) 7(4.8,-1.95) 8(4.8,-1.3) 9(4.8,-0.65) 10(4.8,0)
Top Overlay:
  lines w0.1: 1.025,0.3 1.025,-2.925 3.775,-2.925 3.775,0.3 ; 1.025,0.325 2.15,0.325 ccw(c2.425,0.325) 2.425,0.05 ccw(c2.425,0.275) 2.65,0.275 2.65,0.325 3.775,0.325
3D body: height 0.2, standoff 0, extent -0.225,-2.8 0.45,-2.4
3D body: height 0.6, standoff 0, extent 0.45,-2.8 0.65,-2.4
3D body: height 0.6, standoff 0.4, extent 0.65,-2.8 0.9,-2.4
3D body: height 0.2, standoff 0, extent 4.35,-2.8 5.025,-2.4
3D body: height 0.6, standoff 0, extent 4.15,-2.8 4.35,-2.4
3D body: height 0.6, standoff 0.4, extent 3.9,-2.8 4.15,-2.4
3D body: height 0.6, standoff 0.4, extent 3.9,-0.2 4.15,0.2
3D body: height 0.6, standoff 0, extent 4.15,-0.2 4.35,0.2
3D body: height 0.2, standoff 0, extent 4.35,-0.2 5.025,0.2
3D body: height 0.6, standoff 0.4, extent 3.9,-0.85 4.15,-0.45
3D body: height 0.6, standoff 0, extent 4.15,-0.85 4.35,-0.45
3D body: height 0.2, standoff 0, extent 4.35,-0.85 5.025,-0.45
3D body: height 0.6, standoff 0.4, extent 3.9,-1.5 4.15,-1.1
3D body: height 0.6, standoff 0, extent 4.15,-1.5 4.35,-1.1
3D body: height 0.2, standoff 0, extent 4.35,-1.5 5.025,-1.1
3D body: height 0.6, standoff 0.4, extent 3.9,-2.15 4.15,-1.75
3D body: height 0.6, standoff 0, extent 4.15,-2.15 4.35,-1.75
3D body: height 0.2, standoff 0, extent 4.35,-2.15 5.025,-1.75
3D body: height 0.6, standoff 0.4, extent 0.65,-2.15 0.9,-1.75
3D body: height 0.6, standoff 0, extent 0.45,-2.15 0.65,-1.75
3D body: height 0.2, standoff 0, extent -0.225,-2.15 0.45,-1.75
3D body: height 0.6, standoff 0.4, extent 0.65,-1.5 0.9,-1.1
3D body: height 0.6, standoff 0, extent 0.45,-1.5 0.65,-1.1
3D body: height 0.2, standoff 0, extent -0.225,-1.5 0.45,-1.1
3D body: height 0.6, standoff 0.4, extent 0.65,-0.85 0.9,-0.45
3D body: height 0.6, standoff 0, extent 0.45,-0.85 0.65,-0.45
3D body: height 0.2, standoff 0, extent -0.225,-0.85 0.45,-0.45
3D body: height 1.01, standoff 0, extent 1.227,-0.274 1.825,0.324
3D body: height 0.2, standoff 0, extent -0.225,-0.2 0.45,0.2
3D body: height 0.6, standoff 0, extent 0.45,-0.2 0.65,0.2
3D body: height 0.6, standoff 0.4, extent 0.65,-0.2 0.9,0.2
3D body: height 1, standoff 0, extent 0.9,-3.225 3.9,0.625